# Altium footprint library THU VIEN V1.PcbLib: 400 footprints (part 5 of 25)
Each footprint in its own frame and in the unit in brackets; x right, y up, seen from the top. Pads: shape width x height; smd on the part's side, far side on the other; paste and mask are expansions set on the pad; w line width, h text height; cw(c..) or ccw(c..) is an arc to the next point about the centre after c.
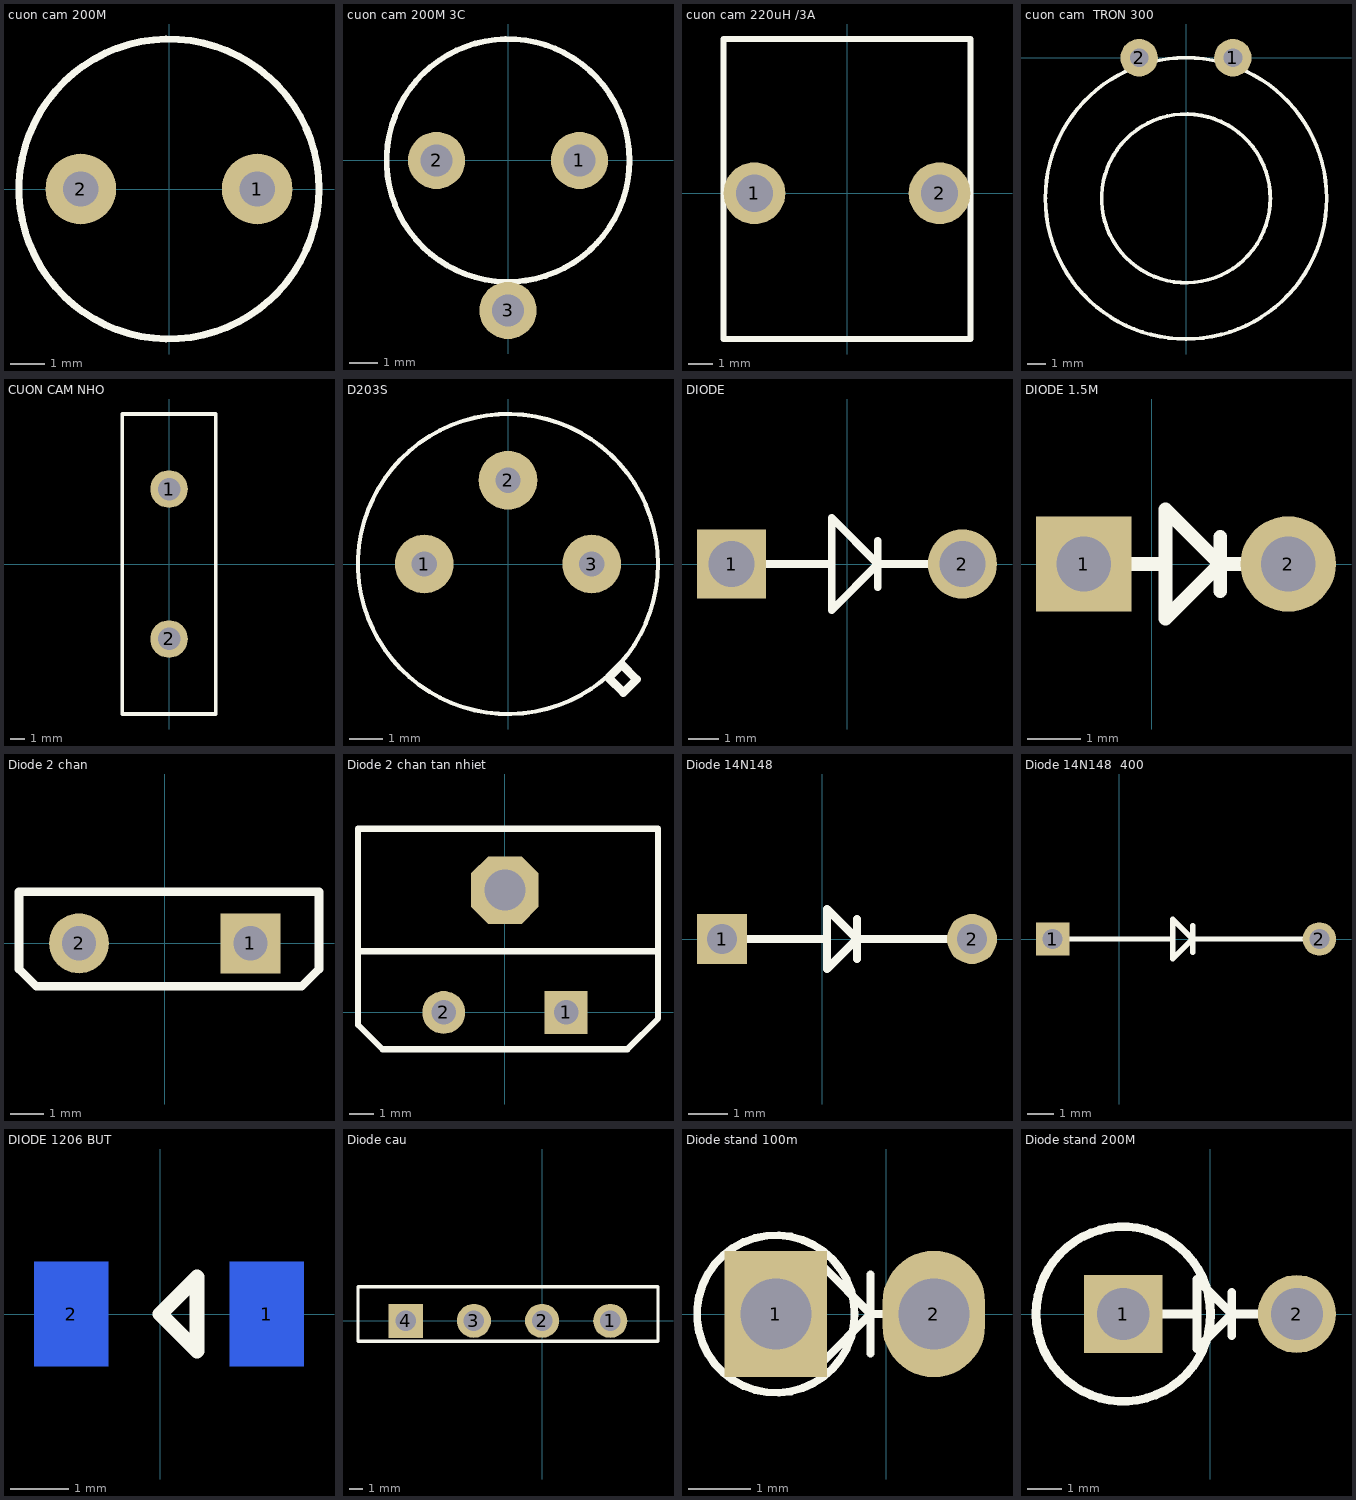
[diagram p4: the footprints below, top view; thin cyan lines are the x and y axes]

## cuon cam 200M [mil]
pads (2):
  round 80 hole 40: 1(100,0) 2(-100,0)
Top Overlay:
  circle w8: c0,0 r170
3D body: height 295.28, standoff -137.8, extent -173.23,-168.5 173.23,177.96

## cuon cam 200M 3C [mil]
pads (3):
  round 80 hole 45: 1(100,0) 2(-100,0) 3(0,-210)
Top Overlay:
  circle w8: c0,0 r170
3D body: height 295.28, standoff -137.8, extent -173.23,-168.5 173.23,177.96

## cuon cam 220uH /3A [mil]
pads (2):
  round 100 hole 60: 1(-150,0) 2(150,0)
Top Overlay:
  lines w10: -200,-236.22 200,-236.22 200,250 -200,250 -200,-236.22

## cuon cam  TRON 300 [mil]
pads (2):
  round 80 hole 40: 1(100,0) 2(-100,0)
Top Overlay:
  circle w8: c0,-300 r180
  circle w8: c0,-300 r300

## CUON CAM NHO [mil]
pads (2):
  round 100 hole 60: 1(0,200) 2(0,-200)
Top Overlay:
  lines w10: -100,-400 125,-400 125,400 -125,400 -125,-400 100,-400

## D203S [mil]
pads (3):
  round 70 hole 30: 1(-100,0) 2(0,100) 3(100,0)
Top Overlay:
  circle w5: c0,0 r179.13
  lines w10: 120.08,-135.83 137.8,-153.54 153.54,-137.8 135.83,-120.08 120.08,-135.83
3D body: height 185.04, standoff -78.74, extent -179.13,-177.93 179.14,179.14

## DIODE [mil]
pads (2):
  rect 90x90 hole 60: 1(-150,0)
  round 90 hole 60: 2(150,0)
Top Overlay:
  lines w10: -140,0 -20,0 ; 40,-30 40,30 ; 150,0 40,0 ; 40,0 -20,-60 -20,60 40,0
3D body: height 125.98, standoff -133.86, extent -165.75,-61.98 165.75,64

## DIODE 1.5M [mil]
pads (2):
  rect 70x70 hole 40: 1(-50,0)
  round 70 hole 40: 2(100,0)
Top Overlay:
  lines w10: -20,0 -50,0 10,0 ; 50,-20 50,20 ; 100,0 50,0 ; 50,0 10,40 10,-40 50,0
3D body: height 50, standoff -280.46, extent -55.49,-52.49 112.51,52.51

## Diode 2 chan [mil]
pads (2):
  rect 70x70 hole 40: 1(100,0)
  round 70 hole 40: 2(-100,0)
Top Overlay:
  lines w10: -170,-30 -150,-50 160,-50 180,-30 180,60 -170,60 -170,-30
3D body: height 745.75, standoff -165, extent -165.66,-40 165.66,70

## Diode 2 chan tan nhiet [mil]
pads (3):
  rect 70x70 hole 40: 1(100,0)
  round 70 hole 40: 2(-100,0)
  oct 110.24x110.24 hole 66.93: ""(0,200)
Top Overlay:
  lines w10: -240,100 250,100 ; -240,-20 -200,-60 200,-60 250,-10 250,300 -240,300 -240,-20
3D body: height 980, standoff -142.05, extent -245.03,44 251.03,299.94
3D body: height 825.75, standoff -85, extent -165.66,-40 165.66,70

## Diode 14N148 [mil]
pads (2):
  rect 50x50 hole 30: 1(-100,0)
  round 50 hole 30: 2(150,0)
Top Overlay:
  lines w8: -100,0 0,0 ; 35,-20 35,20 ; 150,0 35,0 ; 35,0 5,-30 5,30 35,0
3D body: height 69.22, standoff -42, extent -83.5,-34.96 133.5,30

## Diode 14N148  400 [mil]
pads (2):
  rect 50x50 hole 30: 1(-100,0)
  round 50 hole 30: 2(300,0)
Top Overlay:
  lines w8: -100,0 80,0 ; 110,-20 110,20 ; 300,0 110,0 ; 110,0 80,30 80,-30 110,0
3D body: height 69.22, standoff -42, extent -17,-32.48 200,32.48

## DIODE 1206 BUT [mm]
pads (2):
  rect 1.27x1.8 smd far side: 1(1.829,0) 2(-1.524,0)
Top Overlay:
  lines w0.254: 0,0 0.635,0.635 0.635,-0.635 0,0
3D body: height -0.39, standoff -1.84, extent -1.75,-0.725 1.75,0.725

## Diode cau [mil]
pads (4):
  round 100 hole 60: 1(200,0) 2(0,0) 3(-200,0)
  rect 100x100 hole 60: 4(-400,0)
Top Overlay:
  lines w10: -540,-60 -540,100 340,100 340,-60 -540,-60
3D body: height 840.16, standoff -602.14, extent -538.98,-48.03 338.98,100

## Diode stand 100m [mil]
pads (2):
  rect 65x80 hole 45: 1(-70,0)
  oval 65x80 hole 45: 2(30,0)
Top Overlay:
  circle w5: c-70,0 r49.88
  lines w5: -70,0 -40,0 ; -10,-25 -10,25 ; 30,0 -10,0 ; -10,0 -40,-30 -40,30 -10,0
3D body: height 280.46, standoff -50, extent -123,-55 45,50

## Diode stand 200M [mil]
pads (2):
  rect 90x90 hole 60: 1(-100,0)
  round 90 hole 60: 2(100,0)
Top Overlay:
  circle w10: c-100,0 r100.5
  lines w10: -100,0 -15,0 ; 25,-25 25,25 ; 110,0 25,0 ; 25,0 -15,40 -15,30 -15,-40 25,0
3D body: height 494.09, standoff -255.91, extent -202.74,-102.36 121.65,102.76